# Altium footprint library Lapwing.PcbLib: 81 footprints (part 3 of 6)
Each footprint in its own frame and in the unit in brackets; x right, y up, seen from the top. Pads: shape width x height; smd on the part's side, far side on the other; paste and mask are expansions set on the pad; w line width, h text height; cw(c..) or ccw(c..) is an arc to the next point about the centre after c.
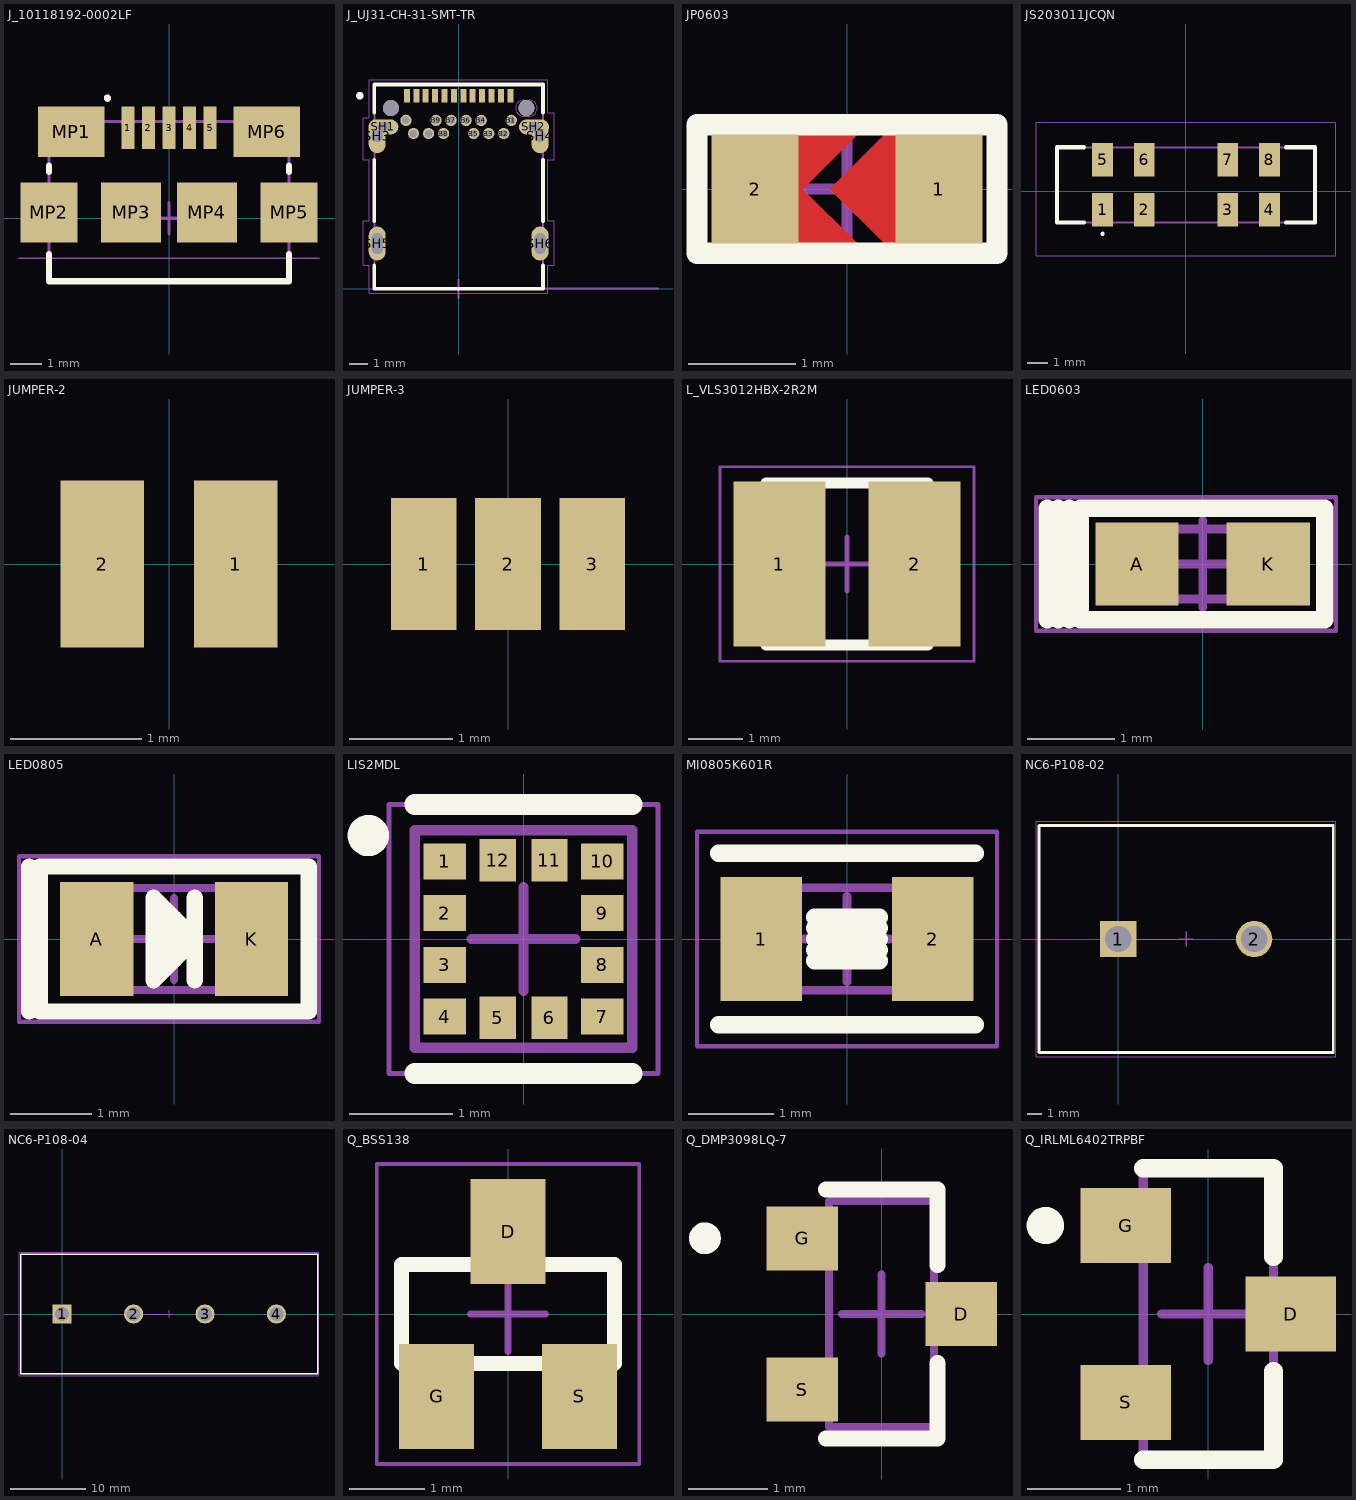
[diagram p2: the footprints below, top view; thin cyan lines are the x and y axes]

## J_10118192-0002LF [mm] "MICROUSB"
pads (11):
  rect 0.4x1.35 smd: 1(-1.3,2.862) 2(-0.65,2.862) 3(0,2.862) 4(0.65,2.862) 5(1.3,2.862)
  rect 2.1x1.6 smd: MP1(-3.1,2.737) MP6(3.1,2.737)
  rect 1.8x1.9 smd: MP2(-3.8,0.188) MP5(3.8,0.188)
  rect 1.9x1.9 smd: MP3(-1.2,0.188) MP4(1.2,0.188)
Top Overlay:
  lines w0.127: -2,3.8 cw(c-1.95,3.8) -1.9,3.8 cw(c-1.95,3.8) -2,3.8
  lines w0.2: -3.8,-1.138 -3.8,-2 3.8,-2 3.8,-1.138 ; -3.8,1.462 -3.8,1.662 ; 3.8,1.462 3.8,1.662
Mechanical 13:
  lines w0.05: -4.75,-1.262 4.75,-1.262
  lines w0.1: -3.8,-2 -3.8,3.068 3.8,3.068 3.8,-2 -3.8,-2
Mechanical 15:
  lines w0.1: -0.5,0 0.5,0 ; 0,-0.5 0,0.5
3D body "10118192-002lfc.stp": height 2.79, standoff 0.02, extent -3.956,-2.032 3.956,3.068

## J_UJ31-CH-31-SMT-TR [mm] "USBC TH/SMD"
pads (32):
  rect 0.32x0.7 smd: A1(-2.75,10.26) A2(-2.25,10.26) A3(-1.75,10.26) A4(-1.25,10.26) A5(-0.75,10.26) A6(-0.25,10.26) A7(0.25,10.26) A8(0.75,10.26) A9(1.25,10.26) A10(1.75,10.26) A11(2.25,10.26) A12(2.75,10.26)
  round 0.6 hole 0.4: B1(2.8,8.95) B2(2.4,8.25) B3(1.6,8.25) B4(1.2,8.95) B5(0.8,8.25) B6(0.4,8.95) B7(-0.4,8.95) B8(-0.8,8.25) B9(-1.2,8.95) B10(-1.6,8.25) B11(-2.4,8.25) B12(-2.8,8.95)
  oval 1.6x0.8 hole 0.6: SH1(-4.005,8.6) SH2(4.005,8.6)
  oval 0.9x1.8 hole 0.6: SH3(-4.33,8.1) SH4(4.33,8.1)
  oval 0.9x1.8 hole 0.6 slot 1.1 at 90 deg: SH5(-4.33,2.4) SH6(4.33,2.4)
  round 0.85 hole 0.85 unplated: ""(-3.6,9.6) ""(3.6,9.6)
Top Overlay:
  circle w0.2: c-5.25,10.26 r0.1
  lines w0.2: -4.48,1.25 -4.48,0 4.48,0 4.48,1.25 ; -4.48,3.6 -4.48,6.85 ; -4.48,9.35 -4.48,10.85 4.48,10.85 4.48,9.35 ; 4.48,3.6 4.48,6.85
Top Solder:
  region: 3.805,10.122 3.859,10.114 3.912,10.099 3.964,10.08 4.012,10.055 4.059,10.025 4.101,9.99 4.14,9.951 4.175,9.909 4.205,9.862 4.23,9.814 4.249,9.762 4.264,9.709 4.272,9.655 4.275,9.6 4.272,9.545 4.264,9.491 4.249,9.438 4.23,9.386 4.205,9.337 4.175,9.291 4.14,9.249 4.101,9.21 4.059,9.175 4.012,9.145 3.964,9.12 3.912,9.101 3.859,9.086 3.805,9.078 3.75,9.075 3.45,9.075 3.395,9.078 3.341,9.086 3.288,9.101 3.236,9.12 3.187,9.145 3.141,9.175 3.099,9.21 3.06,9.249 3.025,9.291 2.995,9.337 2.97,9.386 2.951,9.438 2.936,9.491 2.928,9.545 2.925,9.6 2.928,9.655 2.936,9.709 2.951,9.762 2.97,9.814 2.995,9.862 3.025,9.909 3.06,9.951 3.099,9.99 3.141,10.025 3.187,10.055 3.236,10.08 3.288,10.099 3.341,10.114 3.395,10.122 3.45,10.125 3.75,10.125
Bottom Solder:
  region: 3.805,10.122 3.859,10.114 3.912,10.099 3.964,10.08 4.012,10.055 4.059,10.025 4.101,9.99 4.14,9.951 4.175,9.909 4.205,9.862 4.23,9.814 4.249,9.762 4.264,9.709 4.272,9.655 4.275,9.6 4.272,9.545 4.264,9.491 4.249,9.438 4.23,9.386 4.205,9.337 4.175,9.291 4.14,9.249 4.101,9.21 4.059,9.175 4.012,9.145 3.964,9.12 3.912,9.101 3.859,9.086 3.805,9.078 3.75,9.075 3.45,9.075 3.395,9.078 3.341,9.086 3.288,9.101 3.236,9.12 3.187,9.145 3.141,9.175 3.099,9.21 3.06,9.249 3.025,9.291 2.995,9.337 2.97,9.386 2.951,9.438 2.936,9.491 2.928,9.545 2.925,9.6 2.928,9.655 2.936,9.709 2.951,9.762 2.97,9.814 2.995,9.862 3.025,9.909 3.06,9.951 3.099,9.99 3.141,10.025 3.187,10.055 3.236,10.08 3.288,10.099 3.341,10.114 3.395,10.122 3.45,10.125 3.75,10.125
Mechanical 1:
  lines w0: -4.63,8.1 ccw(c-4.33,8.1) -4.03,8.1 -4.03,8.3 -3.68,8.3 ccw(c-3.68,8.6) -3.68,8.9 -4.33,8.9 ccw(c-4.33,8.6) -4.63,8.6 -4.63,8.1 ; 3.45,9.175 cw(c3.45,9.6) 3.45,10.025 3.75,10.025 cw(c3.75,9.6) 3.75,9.175 3.45,9.175 ; 3.68,8.3 cw(c3.68,8.6) 3.68,8.9 4.33,8.9 cw(c4.33,8.6) 4.63,8.6 4.63,8.1 cw(c4.33,8.1) 4.03,8.1 4.03,8.3 3.68,8.3
Mechanical 13:
  lines w0.1: 10.6,0 4.48,0 ; 4.48,0 -4.48,0 -4.48,10.85 4.48,10.85 4.48,0
  text "PCB EDGE" at 5.007,-0.961 h0.8
Mechanical 15:
  lines w0.05: -5.08,1.25 -5.08,3.6 -4.75,3.6 -4.75,6.85 -5.08,6.85 -5.08,9.1 -4.75,9.1 -4.75,11.1 4.75,11.1 4.75,9.35 5.08,9.35 5.08,6.85 4.75,6.85 4.75,3.6 5.08,3.6 5.08,1.25 4.75,1.25 4.75,-0.25 -4.75,-0.25 -4.75,1.25 -5.08,1.25
  lines w0.1: -0.5,0 0.5,0 ; 0,-0.5 0,0.5
3D body "CUI_DEVICES_UJ31-CH-31-SMT-TR.step": height 3.2, standoff -0.88, extent -4.48,0 4.48,10.85

## JP0603 [mil] "Jumper 0603"
pads (2):
  rect 32x40 smd: 1(33.75,0) 2(-33.75,0)
Top Layer:
  region: -26.25,0 -16.25,0 3.75,-20 -26.25,-20
  region: -26.25,0 -16.25,0 3.75,20 -26.25,20
  region: 23.75,20 13.75,20 -6.25,0 13.75,-20 23.75,-20
Top Overlay:
  lines w7.87: -55.12,-23.62 -55.12,23.62 55.12,23.62 55.12,-23.62 -55.12,-23.62
Top Paste:
  region: -26.25,0 -16.25,0 3.75,-20 -26.25,-20
  region: -26.25,0 -16.25,0 3.75,20 -26.25,20
  region: 23.75,20 13.75,20 -6.25,0 13.75,-20 23.75,-20
Top Solder:
  region: -26.25,0 -12.25,0 11.75,-24 -26.25,-24
  region: -26.25,0 -12.25,0 11.75,24 -26.25,24
  region: 23.75,24 13.75,24 -10.25,0 13.75,-24 23.75,-24
Mechanical 15:
  lines w3.94: -19.68,0 19.68,0 ; 0,-19.68 0,19.68

## JS203011JCQN [mm]
pads (8):
  rect 1x1.6 smd: 1(-4,-0.9) 2(-2,-0.9) 3(2,-0.9) 4(4,-0.9) 5(-4,1.5) 6(-2,1.5) 7(2,1.5) 8(4,1.5)
Top Overlay:
  lines w0.1: -4,-2.1 ccw(c-4,-2.05) -4,-2 ccw(c-4,-2.05) -4,-2.1
  lines w0.2: -4.9,-1.5 -6.2,-1.5 -6.2,2.1 -4.9,2.1 ; 4.8,-1.5 6.2,-1.5 6.2,2.1 4.8,2.1
Mechanical 13:
  lines w0.1: -6.2,-1.5 6.2,-1.5 6.2,2.1 -6.2,2.1 -6.2,-1.5
Mechanical 15:
  lines w0.05: -7.2,-3.1 7.2,-3.1 7.2,3.3 -7.2,3.3 -7.2,-3.1
3D body "JS203011JCQN.stp": height 5.62, standoff 0.02, extent -6.5,-1.5 6.5,2.1

## JUMPER-2 [mil] "PAD-JUMPER-2-NC_BY_TRACE_YES_SILK"
pads (2):
  rect 25x50 smd paste+0: 1(20,0) 2(-20,0)

## JUMPER-3 [mil] "Jumper 3 way"
pads (3):
  rect 25x50 smd paste+0: 1(-32,0) 2(0,0) 3(32,0)

## L_VLS3012HBX-2R2M [mm] "INDUCTOR"
pads (2):
  rect 1.7x3.05 smd: 1(-1.25,0) 2(1.25,0)
Top Overlay:
  lines w0.2: -1.5,-1.5 1.5,-1.5 ; -1.5,1.5 1.5,1.5
Mechanical 13:
  lines w0.1: -1.5,-1.5 1.5,-1.5 1.5,1.5 -1.5,1.5 -1.5,-1.5
Mechanical 15:
  lines w0.05: -2.35,-1.8 2.35,-1.8 2.35,1.8 -2.35,1.8 -2.35,-1.8
  lines w0.1: -0.5,0 0.5,0 ; 0,-0.5 0,0.5
3D body "vls3012hbx.step": height 1.19, standoff -0.01, extent -1.502,-1.509 1.502,1.509

## LED0603 [mm] "LED 0603"
pads (2):
  rect 0.95x0.95 smd: A(-0.75,0) K(0.75,0)
Top Overlay:
  lines w0.2: -1.778,-0.635 -1.778,0.635 ; -1.651,-0.635 -1.651,0.635 ; -1.524,-0.635 -1.524,0.635 ; -1.397,-0.635 1.397,-0.635 1.397,0.635 -1.397,0.635 -1.397,-0.635
Mechanical 13:
  lines w0.1: -0.8,-0.4 0.8,-0.4 0.8,0.4 -0.8,0.4 -0.8,-0.4
Mechanical 15:
  lines w0.05: -1.905,-0.762 1.524,-0.762 1.524,0.762 -1.905,0.762 -1.905,-0.762
  lines w0.1: -0.5,0 0.5,0 ; 0,-0.5 0,0.5
3D body "LED0603.stp": height 0.7, standoff 0, extent -0.8,-0.4 0.8,0.4

## LED0805 [mm] "LED 0805"
pads (2):
  rect 0.9x1.4 smd: A(-0.95,0) K(0.95,0)
Top Overlay:
  lines w0.2: -1.778,-0.889 -1.778,0.889 ; -0.127,-0.381 -0.127,0.381 ; 0,-0.254 0,0.254 ; 0.127,-0.127 0.127,0.127 ; 0.254,-0.508 0.254,0.508 ; -1.651,-0.889 -1.651,0.889 1.651,0.889 1.651,-0.889 -1.651,-0.889 ; -0.254,-0.508 0.254,0 -0.254,0.508 -0.254,-0.508
Mechanical 13:
  lines w0.1: -1,-0.625 1,-0.625 1,0.625 -1,0.625 -1,-0.625
Mechanical 15:
  lines w0.05: -1.905,-1.016 1.778,-1.016 1.778,1.016 -1.905,1.016 -1.905,-1.016
  lines w0.1: -0.5,0 0.5,0 ; 0,-0.5 0,0.5
3D body "LED0805.stp": height 0.7, standoff 0, extent -1,-0.625 1,0.625

## LIS2MDL [mm]
pads (12):
  rect 0.41x0.35 smd: 1(-0.76,0.75) 2(-0.76,0.25) 3(-0.76,-0.25) 4(-0.76,-0.75) 7(0.76,-0.75) 8(0.76,-0.25) 9(0.76,0.25) 10(0.76,0.75)
  rect 0.35x0.41 smd: 5(-0.25,-0.76) 6(0.25,-0.76) 11(0.25,0.76) 12(-0.25,0.76)
Top Overlay:
  circle w0.2: c-1.5,1 r0.1
  lines w0.2: -1.05,-1.3 1.05,-1.3 ; -1.05,1.3 1.05,1.3
Mechanical 13:
  lines w0.1: -1.05,-1.05 -1.05,1.05 1.05,1.05 1.05,-1.05 -1.05,-1.05
Mechanical 15:
  lines w0.05: -1.3,-1.3 -1.3,1.3 1.3,1.3 1.3,-1.3 -1.3,-1.3
  lines w0.1: -0.5,0 0.5,0 ; 0,-0.5 0,0.5
3D body "LIS2MDL.STEP": height 0.7, standoff 0, extent -1,-1 1,1

## MI0805K601R [mm] "FB/IND 0805"
pads (2):
  rect 0.95x1.45 smd: 1(-1,0) 2(1,0)
Top Overlay:
  lines w0.2: -1.5,-1 1.5,-1 ; -1.5,1 1.5,1 ; -0.381,-0.254 0.381,-0.254 ; -0.381,-0.127 0.381,-0.127 ; -0.381,0 0.381,0 ; -0.381,0.127 0.381,0.127 ; -0.381,0.254 0.381,0.254
Mechanical 13:
  lines w0.1: -1,-0.6 -1,0.6 1,0.6 1,-0.6 -1,-0.6
Mechanical 15:
  lines w0.05: -1.75,-1.25 -1.75,1.25 1.75,1.25 1.75,-1.25 -1.75,-1.25
  lines w0.1: -0.5,0 0.5,0 ; 0,-0.5 0,0.5
3D body "FB0805.step": height 1.05, standoff 0, extent -1,-0.625 1,0.625

## NC6-P108-02 [mil] "BARRIER STRIP 2WAY 0.375\""
pads (2):
  rect 100x100 hole 73: 1(0,0)
  round 100 hole 73: 2(375,0)
Top Overlay:
  lines w7.87: -218,-312.5 -218,312.5 593,312.5 593,-312.5 -218,-312.5
Mechanical 13:
  lines w3.94: -218,-312.5 -218,312.5 593,312.5 593,-312.5 -218,-312.5
Mechanical 15:
  lines w1.97: 0,0 187.5,0 ; -226.38,-324.8 600.39,-324.8 600.39,324.8 -226.38,324.8 -226.38,-324.8
  lines w3.94: 167.81,0 207.19,0 ; 187.5,-19.68 187.5,19.68
3D body "c-3-1437664-0-m-3d.stp": height 650, standoff -175, extent -218,-312.5 593,312.5

## NC6-P108-04 [mil] "BARRIER STRIP 4WAY 0.375\""
pads (4):
  rect 100x100 hole 73: 1(0,0)
  round 100 hole 73: 2(375,0) 3(750,0) 4(1125,0)
Top Overlay:
  lines w7.87: -218,-312.5 1341,-312.5 1341,312.5 -218,312.5 -218,-312.5
Mechanical 13:
  lines w3.94: -218,-312.5 1341,-312.5 1341,312.5 -218,312.5 -218,-312.5
Mechanical 15:
  lines w1.97: 375,0 562.5,0 ; -226.38,-324.8 -226.38,324.8 1348.43,324.8 1348.43,-324.8 -226.38,-324.8
  lines w3.94: 542.82,0 582.18,0 ; 562.5,-19.68 562.5,19.68
3D body "c-3-1437664-3-m-3d.stp": height 650, standoff -175, extent -218,-312.5 1343,312.5

## Q_BSS138 [mm] "FET SOT23"
pads (3):
  rect 1x1.4 smd: D(0,1.1) G(-0.95,-1.1) S(0.95,-1.1)
Top Overlay:
  lines w0.2: -1.422,-0.66 -1.422,0.66 1.422,0.66 1.422,-0.66 -1.422,-0.66
Mechanical 13:
  lines w0.1: -1.422,-0.66 -1.422,0.66 1.422,0.66 1.422,-0.66 -1.422,-0.66
Mechanical 15:
  lines w0.05: -1.75,-2 -1.75,2 1.75,2 1.75,-2 -1.75,-2
  lines w0.1: -0.5,0 0.5,0 ; 0,-0.5 0,0.5
3D body "SOT23.stp": height 1.2, standoff 0, extent -1.45,-1.2 1.45,1.2

## Q_DMP3098LQ-7 [mm] "FET SOT23"
pads (3):
  rect 0.9x0.8 smd: D(1,0) G(-1,0.95) S(-1,-0.95)
Top Overlay:
  circle w0.2: c-2.222,0.953 r0.1
  lines w0.2: -0.7,-1.565 0.7,-1.565 0.7,-0.615 ; -0.7,1.565 0.7,1.565 0.7,0.615
Mechanical 13:
  lines w0.1: -0.66,-1.422 -0.66,1.422 0.66,1.422 0.66,-1.422 -0.66,-1.422
Mechanical 15:
  lines w0.1: -0.5,0 0.5,0 ; 0,-0.5 0,0.5
3D body "DMP3099L-13.stp": height 1.2, standoff 0, extent -1.2,-1.45 1.2,1.45

## Q_IRLML6402TRPBF [mm] "FET SOT23"
pads (3):
  rect 0.972x0.802 smd: D(0.885,0) G(-0.885,0.95) S(-0.885,-0.95)
Top Overlay:
  circle w0.2: c-1.75,0.95 r0.1
  lines w0.2: -0.7,-1.565 0.7,-1.565 0.7,-0.615 ; -0.7,1.565 0.7,1.565 0.7,0.615
Mechanical 13:
  lines w0.1: -0.7,-1.52 -0.7,1.52 0.7,1.52 0.7,-1.52 -0.7,-1.52
Mechanical 15:
  lines w0.1: -0.5,0 0.5,0 ; 0,-0.5 0,0.5
3D body "SOT23.stp": height 1.2, standoff 0, extent -1.2,-1.45 1.2,1.45